# Altium footprint library common.PcbLib: 552 footprints (part 11 of 35)
Each footprint in its own frame and in the unit in brackets; x right, y up, seen from the top. Pads: shape width x height; smd on the part's side, far side on the other; paste and mask are expansions set on the pad; w line width, h text height; cw(c..) or ccw(c..) is an arc to the next point about the centre after c.
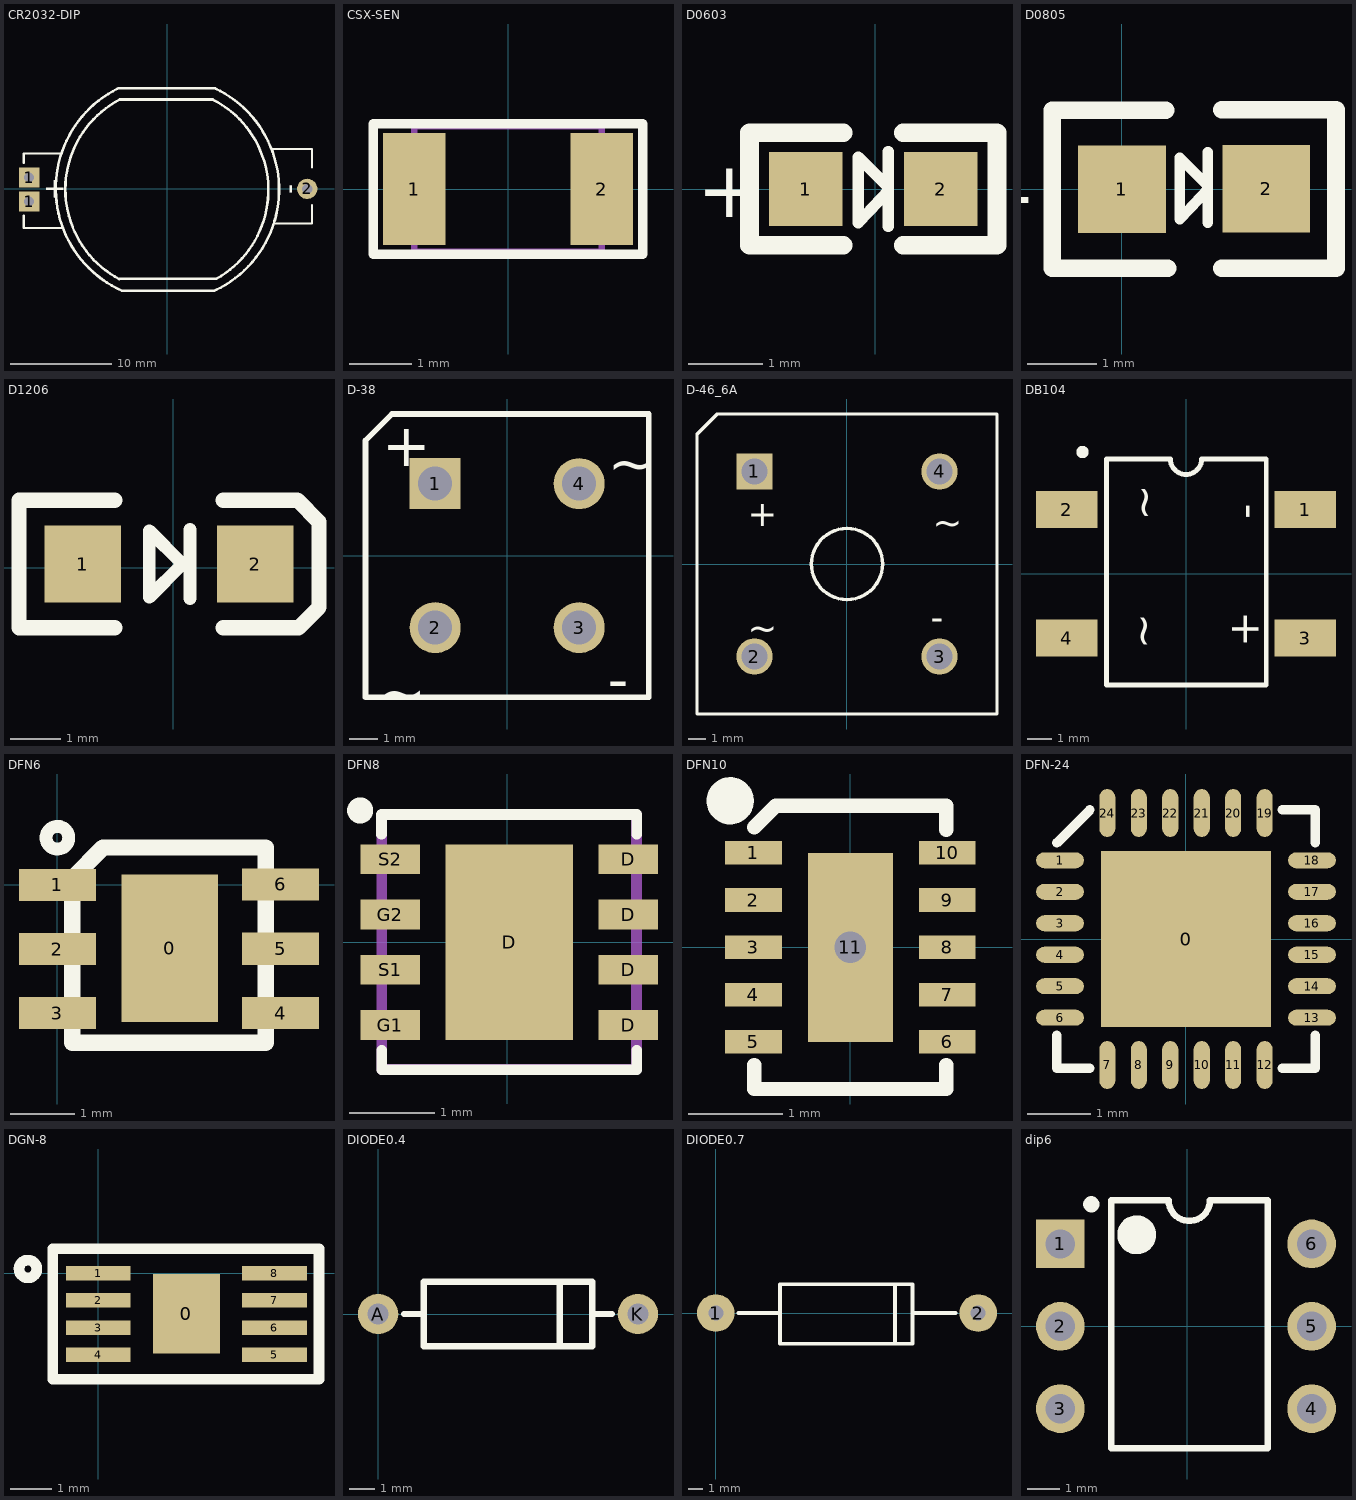
[diagram p10: the footprints below, top view; thin cyan lines are the x and y axes]

## CR2032-DIP [mm] "锂电池座"
height 1.45
pads (3):
  rect 2x2 hole 1: 1(-13.614,-1.27) 1(-13.614,1.092)
  round 2 hole 1: 2(13.767,-0.025)
Top Overlay:
  lines w0.2: -14.148,-2.642 -14.148,-3.861 -10.287,-3.861 ; -14.148,2.54 -14.148,3.48 -10.566,3.48 ; 10.262,3.912 14.249,3.912 14.249,2.076 ; 10.439,-3.429 14.249,-3.429 14.249,-1.594
  lines w0.254: -4.857,9.87 ccw(c0,0) -4.472,-10.05 ; -4.826,9.881 4.623,9.881 ; -4.724,-8.917 cw(c-0.051,-0.076) -4.705,8.775 4.472,8.775 ; -4.724,-8.893 4.83,-8.893 ; -4.47,-10.058 4.623,-10.058 ; 4.472,8.765 cw(c-0.056,-0.151) 4.821,-8.881 ; 4.683,9.876 cw(c-0.005,-0.074) 4.725,-10.006
  text "-" at 12.929,-0.559 h2
  text "+" at -12.217,-0.914 h2
3D body: height 6.3, standoff -2.75, extent -14.475,-10.101 14.525,9.898

## CSX-SEN [mm]
height 0.051
pads (2):
  rect 1x1.8 smd: 1(-1.5,0) 2(1.5,0)
Top Overlay:
  lines w0.152: -2.159,-1.041 -2.159,1.041 2.159,1.041 2.159,-1.041 -2.159,-1.041
Mechanical 13:
  lines w0.1: -1.5,-1 -1.5,1 1.5,1 1.5,-1 -1.5,-1
3D body: height 1.8, standoff 0, extent -1.5,-0.9 1.5,0.9

## D0603 [mm]
pads (2):
  rect 1x1 smd: 1(-0.94,0) 2(0.889,0)
Top Overlay:
  lines w0.152: 0.178,-0.508 0.178,0.508 ; 0.178,-0.025 -0.229,-0.457 -0.229,0.432 0.178,0.025
  lines w0.254: -0.432,-0.762 -1.702,-0.762 -1.702,0.762 -0.432,0.762 ; 0.381,-0.762 1.651,-0.762 1.651,0.762 0.381,0.762
  text "+" at -2.413,-0.381 h0.76
3D body: height 0.46, standoff 0, extent -0.28,-0.279 0.255,0.279
3D body: height 0.38, standoff 0, extent -0.603,-0.533 0.567,0.533
3D body: height 0.38, standoff 0, extent -1.026,-0.535 -0.602,0.535
3D body: height 0.38, standoff 0, extent 0.563,-0.532 0.988,0.532

## D0805 [mm] "1/8W"
pads (2):
  rect 1.27x1.27 smd: 1(0,0) 2(2.09,0.005)
Top Overlay:
  lines w0.152: 1.245,-0.483 1.245,0.533 ; 1.245,0 0.838,-0.432 0.838,0.457 1.245,0.051
  lines w0.254: 0.635,1.143 -1.011,1.143 -1.011,-1.143 0.66,-1.143 ; 1.448,-1.143 3.099,-1.143 3.099,1.148 1.448,1.148
  text "+" at -1.245,-0.483 h0.76
3D body: height 0.38, standoff 0, extent 1.794,-0.635 2.219,0.635
3D body: height 0.38, standoff 0, extent -0.009,-0.635 0.416,0.635
3D body: height 0.38, standoff 0, extent 0.404,-0.635 1.807,0.635
3D body: height 0.46, standoff 0, extent 0.838,-0.279 1.373,0.279

## D1206 [mil] "LL34"
pads (2):
  rect 60x60 smd: 1(-71,3) 2(64,3)
Top Overlay:
  lines w10: 13,-24 13,30 ; -19,-23 -19,-12 -19,29 7,3 -19,-23
  lines w12: -46,-47 -121,-47 -121,53 -46,53 ; 39,-47 98,-47 114,-31 114,36 97,53 39,53
3D body: height 59.06, standoff 0, extent -72.9,-26.53 64.9,32.53

## D-38 [mm] "Bridge Rectifier; 4 Terminals; Body 9.4 x 9.4 mm (typ); Pitch 5.08 mm"
height 9.91
pads (4):
  rect 1.8x1.8 hole 1.2: 1(-2.54,2.54)
  round 1.8 hole 1.2: 2(-2.54,-2.54) 3(2.54,-2.54) 4(2.54,2.54)
Top Overlay:
  lines w0.2: -5,-5 -5,4.064 -4.064,5 5,5 5,-5 -5,-5
  text "+" at -4.41,3.164 h1.5
  text "-" at 3.556,-5.08 h1.5
  text "~" at -4.572,-5.588 h1.5
  text "~" at 3.556,2.54 h1.5
3D body: height 3.1, standoff 0, extent -4.978,-5.105 5.022,4.895

## D-46_6A [mm] "Bridge Rectifier; 4 Terminals; Body 16.8 x 16.8 mm (typ); Pitch 10.67 mm"
height 6.35
pads (4):
  rect 2.1x2.1 hole 1.5: 1(-5.335,5.335)
  round 2.1 hole 1.5: 2(-5.335,-5.335) 3(5.335,-5.335) 4(5.335,5.335)
Top Overlay:
  circle w0.2: c0,0 r2.05
  lines w0.2: -8.65,-8.65 8.65,-8.65 8.65,8.65 -7.474,8.65 -8.65,7.474 -8.65,-8.65
  text "~" at -5.723,-4.437 h1.5
  text "~" at 4.945,1.659 h1.5
  text "-" at 4.825,-3.809 h1.5
  text "+" at -5.723,2.167 h1.5
3D body: height 3.1, standoff 0, extent -8.466,-8.449 8.534,8.551

## DB104 [mm] "光耦（未加焊）"
height 5.6
pads (4):
  rect 2.5x1.5 smd: 1(4.826,2.604) 2(-4.826,2.604) 3(4.826,-2.603) 4(-4.826,-2.603)
Top Overlay:
  circle w0.25: c-4.191,4.935 r0.125
  lines w0.2: 0.635,4.661 cw(c0,4.661) -0.635,4.661 -3.226,4.661 -3.226,-4.496 3.251,-4.496 3.251,4.661 0.711,4.661
  text "~" at -1.168,-3.048 h1.27
  text "~" at -1.118,2.159 h1.27
  text "-" at 2.997,2.21 h1.27
  text "+" at 2.946,-2.972 h1.27
3D body: height 2.61, standoff 0.02, extent -5.125,-4.111 5.175,4.089

## DFN6 [mm]
pads (7):
  rect 1.5x2.3 smd: 0(1.753,-0.991)
  rect 1.2x0.5 smd: 1(0,0) 2(0,-1) 3(0,-2) 4(3.48,-2) 5(3.48,-0.995) 6(3.48,0.01)
Top Overlay:
  circle w0.2: c0,0.737 r0.177
  lines w0.254: 0.229,-2.464 3.251,-2.464 3.251,0.584 0.711,0.584 0.229,0.102 0.229,-2.464
3D body: height 1, standoff 0, extent 0.229,-2.464 3.251,0.584

## DFN8 [mm] "3 PHASE MOSFET"
pads (9):
  rect 1.5x2.3 smd: D(0.025,0)
  rect 0.7x0.35 smd: D(1.425,-0.975) D(1.425,-0.325) D(1.425,0.325) D(1.425,0.975) G1(-1.375,-0.975) G2(-1.375,0.325) S1(-1.375,-0.325) S2(-1.375,0.975)
Top Overlay:
  circle w0.254: c-1.727,1.549 r0.025
  lines w0.127: -1.475,1.27 -1.475,1.5 1.525,1.5 1.525,1.27 ; -1.473,-1.27 -1.473,-1.5 1.525,-1.5 1.525,-1.27
Mechanical 2:
  lines w0.127: -1.473,-1.499 1.524,-1.499 1.524,1.499 -1.473,1.499 -1.473,-1.499
3D body: height 0.8, standoff 0, extent -1.473,-1.501 1.547,1.499

## DFN10 [mm] "2X3-0.5pich"
pads (11):
  rect 0.6x0.25 smd: 1(-1.025,1) 2(-1.025,0.5) 3(-1.025,0) 4(-1.025,-0.5) 5(-1.025,-1) 6(1.025,-1) 7(1.025,-0.5) 8(1.025,0) 9(1.025,0.5) 10(1.025,1)
  rect 0.9x2 smd: 11(0,0)
via 0,0 diameter 0.66 hole 0.33
Top Overlay:
  circle w0.25: c-1.27,1.549 r0.125
  lines w0.152: -1.016,-1.245 -1.016,-1.499 0.508,-1.499 ; -1.016,1.27 -0.787,1.499 1.016,1.499 1.016,1.245 ; 0.5,-1.499 1.016,-1.499 1.016,-1.245
3D body: height 0.8, standoff 0, extent -1.06,-1.55 1.06,1.55

## DFN-24 [mm]
pads (25):
  rect 2.7x2.8 smd: 0(0,0)
  oval 0.762x0.254 smd: 1(-2,1.25) 2(-2,0.75) 3(-2,0.25) 4(-2,-0.25) 5(-2,-0.75) 6(-2,-1.25) 13(2,-1.25) 14(2,-0.75) 15(2,-0.25) 16(2,0.25) 17(2,0.75) 18(2,1.25)
  oval 0.254x0.762 smd: 7(-1.25,-2) 8(-0.75,-2) 9(-0.25,-2) 10(0.25,-2) 11(0.75,-2) 12(1.25,-2) 19(1.25,2) 20(0.75,2) 21(0.25,2) 22(-0.25,2) 23(-0.75,2) 24(-1.25,2)
Top Overlay:
  lines w0.152: -2.05,-1.525 -2.05,-2.05 -1.525,-2.05 ; -2.05,1.525 -1.525,2.05 ; 1.525,-2.05 2.05,-2.05 2.05,-1.525 ; 1.525,2.05 2.05,2.05 2.05,1.525
Mechanical 15:
  lines w0.1: -0.5,0 0.5,0 ; 0,-0.5 0,0.5
3D body: height 0.95, standoff 0, extent -2.055,-2.06 2.045,2.04

## DGN-8 [mm]
pads (9):
  rect 1.6x1.9 smd: 0(2.108,-0.965)
  rect 1.55x0.35 smd: 1(0,0) 2(0,-0.65) 3(0,-1.3) 4(0,-1.95) 5(4.216,-1.95) 6(4.216,-1.3) 7(4.216,-0.65) 8(4.216,0)
Top Overlay:
  lines w0.254: -1.518,0.233 ccw(c-1.686,0.102) -1.509,0.222 ; -1.092,-2.54 -1.092,0.584 5.283,0.584 5.283,-2.54 -1.092,-2.54
3D body: height 1.05, standoff -0.05, extent -0.335,-2.54 4.602,0.56

## DIODE0.4 [mil]
pads (2):
  round 62 hole 32: A(0,0) K(400,0)
Top Overlay:
  lines w10: 40,0 70,0 ; 280,-50 280,50 ; 330,0 360,0 ; 70,-50 330,-50 330,50 70,50 70,-50
3D body: height 58.74, standoff -149.92, extent -19.72,-53.36 415.71,49

## DIODE0.7 [mil]
pads (2):
  round 100 hole 40: 1(0,0) 2(700,0)
Top Overlay:
  lines w10: 60,0 170,0 ; 478,-82 478,77 ; 528,0 640,0 ; 171,-82 171,77 525,77 525,-82 171,-82
3D body: height 151.18, standoff -118.11, extent -17.85,-74.88 721.85,70

## dip6 [mm]
pads (6):
  rect 1.5x1.5 hole 0.9: 1(-3.912,2.54)
  round 1.5 hole 0.9: 2(-3.912,0) 3(-3.912,-2.54) 4(3.835,-2.54) 5(3.835,0) 6(3.835,2.54)
Top Overlay:
  circle w0.6: c-1.557,2.819 r0.3
  circle w0.25: c-2.957,3.759 r0.125
  lines w0.2: -2.349,-3.759 2.476,-3.759 2.476,3.88 0.699,3.88 cw(c0.064,3.88) -0.572,3.88 -2.349,3.88 -2.349,-3.759
3D body: height 4.31, standoff -3.28, extent -4.038,-3.991 3.962,4.089